# Altium footprint library ref-packages-longpad.PCBLIB: 1527 footprints (part 45 of 103) (continued)
## QFP64_SOT393 [mm] (continued)
  rectangle: -8.6,-1.35 -7.075,-1.05
  rectangle: -8.6,-2.15 -7.075,-1.85
  rectangle: -8.6,-2.95 -7.075,-2.65
  rectangle: -8.6,-3.75 -7.075,-3.45
  rectangle: -8.6,-4.55 -7.075,-4.25
  rectangle: -8.6,-5.35 -7.075,-5.05
  rectangle: -8.6,-6.15 -7.075,-5.85

## QFP80 [mm]
pads (80):
  rect 0.35x1.9 smd: 1(-8.8,-7.53) 2(-8,-7.53) 3(-7.2,-7.53) 4(-6.4,-7.53) 5(-5.6,-7.53) 6(-4.8,-7.53) 7(-4,-7.53) 8(-3.2,-7.53) 9(-2.4,-7.53) 10(-1.6,-7.53) 11(-0.8,-7.53) 12(0,-7.53) 13(0.8,-7.53) 14(1.6,-7.53) 15(2.4,-7.53) 16(3.2,-7.53) 17(4,-7.53) 18(4.8,-7.53) 19(5.6,-7.53) 20(6.4,-7.53) 21(7.2,-7.53) 22(8,-7.53) 23(8.8,-7.53) 24(9.6,-7.53) 41(9.6,8.47) 42(8.8,8.47) 43(8,8.47) 44(7.2,8.47) 45(6.4,8.47) 46(5.6,8.47) 47(4.8,8.47) 48(4,8.47) 49(3.2,8.47) 50(2.4,8.47) 51(1.6,8.47) 52(0.8,8.47) 53(0,8.47) 54(-0.8,8.47) 55(-1.6,8.47) 56(-2.4,8.47) 57(-3.2,8.47) 58(-4,8.47) 59(-4.8,8.47) 60(-5.6,8.47) 61(-6.4,8.47) 62(-7.2,8.47) 63(-8,8.47) 64(-8.8,8.47)
  rect 1.9x0.35 smd: 25(11.4,-5.53) 26(11.4,-4.73) 27(11.4,-3.93) 28(11.4,-3.13) 29(11.4,-2.33) 30(11.4,-1.53) 31(11.4,-0.73) 32(11.4,0.07) 33(11.4,0.87) 34(11.4,1.67) 35(11.4,2.47) 36(11.4,3.27) 37(11.4,4.07) 38(11.4,4.87) 39(11.4,5.67) 40(11.4,6.47) 65(-10.6,6.47) 66(-10.6,5.67) 67(-10.6,4.87) 68(-10.6,4.07) 69(-10.6,3.27) 70(-10.6,2.47) 71(-10.6,1.67) 72(-10.6,0.87) 73(-10.6,0.07) 74(-10.6,-0.73) 75(-10.6,-1.53) 76(-10.6,-2.33) 77(-10.6,-3.13) 78(-10.6,-3.93) 79(-10.6,-4.73) 80(-10.6,-5.53)
Top Overlay:
  circle w0.152: c-7.06,-3.92 r1
  rectangle: -8.975,7.52 -8.625,9.42
  rectangle: 9.425,-8.48 9.775,-6.58
  rectangle: -8.175,7.52 -7.825,9.42
  rectangle: -7.375,7.52 -7.025,9.42
  rectangle: -6.575,7.52 -6.225,9.42
  rectangle: -5.775,7.52 -5.425,9.42
  rectangle: -4.975,7.52 -4.625,9.42
  rectangle: -4.175,7.52 -3.825,9.42
  rectangle: -3.375,7.52 -3.025,9.42
  rectangle: -2.575,7.52 -2.225,9.42
  rectangle: -1.775,7.52 -1.425,9.42
  rectangle: -0.975,7.52 -0.625,9.42
  rectangle: -0.175,7.52 0.175,9.42
  rectangle: 0.625,7.52 0.975,9.42
  rectangle: 1.425,7.52 1.775,9.42
  rectangle: 2.225,7.52 2.575,9.42
  rectangle: 3.025,7.52 3.375,9.42
  rectangle: 3.825,7.52 4.175,9.42
  rectangle: 4.625,7.52 4.975,9.42
  rectangle: 5.425,7.52 5.775,9.42
  rectangle: 6.225,7.52 6.575,9.42
  rectangle: 7.025,7.52 7.375,9.42
  rectangle: 7.825,7.52 8.175,9.42
  rectangle: 8.625,7.52 8.975,9.42
  rectangle: 9.425,7.52 9.775,9.42
  rectangle: -8.975,-8.48 -8.625,-6.58
  rectangle: -8.175,-8.48 -7.825,-6.58
  rectangle: -7.375,-8.48 -7.025,-6.58
  rectangle: -6.575,-8.48 -6.225,-6.58
  rectangle: -5.775,-8.48 -5.425,-6.58
  rectangle: -4.975,-8.48 -4.625,-6.58
  rectangle: -4.175,-8.48 -3.825,-6.58
  rectangle: -3.375,-8.48 -3.025,-6.58
  rectangle: -2.575,-8.48 -2.225,-6.58
  rectangle: -1.775,-8.48 -1.425,-6.58
  rectangle: -0.975,-8.48 -0.625,-6.58
  rectangle: -0.175,-8.48 0.175,-6.58
  rectangle: 0.625,-8.48 0.975,-6.58
  rectangle: 1.425,-8.48 1.775,-6.58
  rectangle: 2.225,-8.48 2.575,-6.58
  rectangle: 3.825,-8.48 4.175,-6.58
  rectangle: 3.025,-8.48 3.375,-6.58
  rectangle: 4.625,-8.48 4.975,-6.58
  rectangle: 5.425,-8.48 5.775,-6.58
  rectangle: 6.225,-8.48 6.575,-6.58
  rectangle: 7.025,-8.48 7.375,-6.58
  rectangle: 7.825,-8.48 8.175,-6.58
  rectangle: 8.625,-8.48 8.975,-6.58
  rectangle: 10.45,-0.105 12.35,0.245
  rectangle: -11.55,-5.705 -9.65,-5.355
  rectangle: 10.45,0.695 12.35,1.045
  rectangle: 10.45,1.495 12.35,1.845
  rectangle: 10.45,2.295 12.35,2.645
  rectangle: 10.45,3.095 12.35,3.445
  rectangle: 10.45,3.895 12.35,4.245
  rectangle: 10.45,4.695 12.35,5.045
  rectangle: 10.45,5.495 12.35,5.845
  rectangle: 10.45,6.295 12.35,6.645
  rectangle: 10.45,-0.905 12.35,-0.555
  rectangle: 10.45,-1.705 12.35,-1.355
  rectangle: 10.45,-2.505 12.35,-2.155
  rectangle: 10.45,-3.305 12.35,-2.955
  rectangle: 10.45,-4.105 12.35,-3.755
  rectangle: 10.45,-4.905 12.35,-4.555
  rectangle: 10.45,-5.705 12.35,-5.355
  rectangle: -11.55,6.295 -9.65,6.645
  rectangle: -11.55,5.495 -9.65,5.845
  rectangle: -11.55,4.695 -9.65,5.045
  rectangle: -11.55,3.895 -9.65,4.245
  rectangle: -11.55,3.095 -9.65,3.445
  rectangle: -11.55,2.295 -9.65,2.645
  rectangle: -11.55,1.495 -9.65,1.845
  rectangle: -11.55,0.695 -9.65,1.045
  rectangle: -11.55,-0.105 -9.65,0.245
  rectangle: -11.55,-0.905 -9.65,-0.555
  rectangle: -11.55,-1.705 -9.65,-1.355
  rectangle: -11.55,-2.505 -9.65,-2.155
  rectangle: -11.55,-3.305 -9.65,-2.955
  rectangle: -11.55,-4.105 -9.65,-3.755
  rectangle: -11.55,-4.905 -9.65,-4.555
  lines w0.152: -9.2,5.47 -9.2,5.67 ; -9.6,-5.93 -9,-6.53 ; -9.6,-5.93 -9.6,6.87 ; -9.6,-5.93 -9.2,-5.73 ; -9.6,6.87 -9,7.47 ; -9.6,6.87 -9.2,6.67 ; -9.2,-5.73 -8.8,-6.13 ; -9.2,-5.73 -9.2,5.67 ; -9.2,5.67 -9.2,6.67 ; -9.2,6.67 -8.8,7.07 ; -9,-6.53 9.8,-6.53 ; -9,-6.53 -8.8,-6.13 ; -9,7.47 9.8,7.47 ; -9,7.47 -8.8,7.07 ; -8.8,-6.13 9.6,-6.13 ; -8.8,7.07 9.6,7.07 ; 9.6,-6.13 10,-5.73 ; 9.6,-6.13 9.8,-6.53 ; 9.6,7.07 10,6.67 ; 9.6,7.07 9.8,7.47 ; 9.8,-6.53 10.4,-5.93 ; 9.8,7.47 10.4,6.87 ; 10,-5.73 10,6.67 ; 10,-5.73 10.4,-5.93 ; 10,6.67 10.4,6.87 ; 10.4,-5.93 10.4,6.87

## QFP80-841 [mm]
pads (80):
  rect 1.2x0.4 smd: 1(-8.3,6.175) 2(-8.3,5.525) 3(-8.3,4.875) 4(-8.3,4.225) 5(-8.3,3.575) 6(-8.3,2.925) 7(-8.3,2.275) 8(-8.3,1.625) 9(-8.3,0.975) 10(-8.3,0.325) 11(-8.3,-0.325) 12(-8.3,-0.975) 13(-8.3,-1.625) 14(-8.3,-2.275) 15(-8.3,-2.925) 16(-8.3,-3.575) 17(-8.3,-4.225) 18(-8.3,-4.875) 19(-8.3,-5.525) 20(-8.3,-6.175) 41(8.3,-6.175) 42(8.3,-5.525) 43(8.3,-4.875) 44(8.3,-4.225) 45(8.3,-3.575) 46(8.3,-2.925) 47(8.3,-2.275) 48(8.3,-1.625) 49(8.3,-0.975) 50(8.3,-0.325) 51(8.3,0.325) 52(8.3,0.975) 53(8.3,1.625) 54(8.3,2.275) 55(8.3,2.925) 56(8.3,3.575) 57(8.3,4.225) 58(8.3,4.875) 59(8.3,5.525) 60(8.3,6.175)
  rect 0.4x1.2 smd: 21(-6.175,-8.3) 22(-5.525,-8.3) 23(-4.875,-8.3) 24(-4.225,-8.3) 25(-3.575,-8.3) 26(-2.925,-8.3) 27(-2.275,-8.3) 28(-1.625,-8.3) 29(-0.975,-8.3) 30(-0.325,-8.3) 31(0.325,-8.3) 32(0.975,-8.3) 33(1.625,-8.3) 34(2.275,-8.3) 35(2.925,-8.3) 36(3.575,-8.3) 37(4.225,-8.3) 38(4.875,-8.3) 39(5.525,-8.3) 40(6.175,-8.3) 61(6.175,8.3) 62(5.525,8.3) 63(4.875,8.3) 64(4.225,8.3) 65(3.575,8.3) 66(2.925,8.3) 67(2.275,8.3) 68(1.625,8.3) 69(0.975,8.3) 70(0.325,8.3) 71(-0.325,8.3) 72(-0.975,8.3) 73(-1.625,8.3) 74(-2.275,8.3) 75(-2.925,8.3) 76(-3.575,8.3) 77(-4.225,8.3) 78(-4.875,8.3) 79(-5.525,8.3) 80(-6.175,8.3)
Top Overlay:
  circle w0.152: c-6.15,6.1 r0.354
  lines w0.152: -6.98,-6.98 6.98,-6.98 6.98,6.98 -6.43,6.98 -6.98,6.43 -6.98,-6.98
Mechanical 16:
  rectangle: -8.7,6 -7.02,6.35
  rectangle: -8.7,5.35 -7.02,5.7
  rectangle: -8.7,4.7 -7.02,5.05
  rectangle: -8.7,4.05 -7.02,4.4
  rectangle: -8.7,3.4 -7.02,3.75
  rectangle: -8.7,2.75 -7.02,3.1
  rectangle: -8.7,2.1 -7.02,2.45
  rectangle: -8.7,1.45 -7.02,1.8
  rectangle: -8.7,0.8 -7.02,1.15
  rectangle: -8.7,0.15 -7.02,0.5
  rectangle: -8.7,-0.5 -7.02,-0.15
  rectangle: -8.7,-1.15 -7.02,-0.8
  rectangle: -8.7,-1.8 -7.02,-1.45
  rectangle: -8.7,-2.45 -7.02,-2.1
  rectangle: -8.7,-3.1 -7.02,-2.75
  rectangle: -8.7,-3.75 -7.02,-3.4
  rectangle: -8.7,-4.4 -7.02,-4.05
  rectangle: -8.7,-5.05 -7.02,-4.7
  rectangle: -8.7,-5.7 -7.02,-5.35
  rectangle: -8.7,-6.35 -7.02,-6
  rectangle: -6.35,-8.7 -6,-7.02
  rectangle: -5.7,-8.7 -5.35,-7.02
  rectangle: -5.05,-8.7 -4.7,-7.02
  rectangle: -4.4,-8.7 -4.05,-7.02
  rectangle: -3.75,-8.7 -3.4,-7.02
  rectangle: -3.1,-8.7 -2.75,-7.02
  rectangle: -2.45,-8.7 -2.1,-7.02
  rectangle: -1.8,-8.7 -1.45,-7.02
  rectangle: -1.15,-8.7 -0.8,-7.02
  rectangle: -0.5,-8.7 -0.15,-7.02
  rectangle: 0.15,-8.7 0.5,-7.02
  rectangle: 0.8,-8.7 1.15,-7.02
  rectangle: 1.45,-8.7 1.8,-7.02
  rectangle: 2.1,-8.7 2.45,-7.02
  rectangle: 2.75,-8.7 3.1,-7.02
  rectangle: 3.4,-8.7 3.75,-7.02
  rectangle: 4.05,-8.7 4.4,-7.02
  rectangle: 4.7,-8.7 5.05,-7.02
  rectangle: 5.35,-8.7 5.7,-7.02
  rectangle: 6,-8.7 6.35,-7.02
  rectangle: 7.02,-6.35 8.7,-6
  rectangle: 7.02,-5.7 8.7,-5.35
  rectangle: 7.02,-5.05 8.7,-4.7
  rectangle: 7.02,-4.4 8.7,-4.05
  rectangle: 7.02,-3.75 8.7,-3.4
  rectangle: 7.02,-3.1 8.7,-2.75
  rectangle: 7.02,-2.45 8.7,-2.1
  rectangle: 7.02,-1.8 8.7,-1.45
  rectangle: 7.02,-1.15 8.7,-0.8
  rectangle: 7.02,-0.5 8.7,-0.15
  rectangle: 7.02,0.15 8.7,0.5
  rectangle: 7.02,0.8 8.7,1.15
  rectangle: 7.02,1.45 8.7,1.8
  rectangle: 7.02,2.1 8.7,2.45
  rectangle: 7.02,2.75 8.7,3.1
  rectangle: 7.02,3.4 8.7,3.75
  rectangle: 7.02,4.05 8.7,4.4
  rectangle: 7.02,4.7 8.7,5.05
  rectangle: 7.02,5.35 8.7,5.7
  rectangle: 7.02,6 8.7,6.35
  rectangle: 6,7.02 6.35,8.7
  rectangle: 5.35,7.02 5.7,8.7
  rectangle: 4.7,7.02 5.05,8.7
  rectangle: 4.05,7.02 4.4,8.7
  rectangle: 3.4,7.02 3.75,8.7
  rectangle: 2.75,7.02 3.1,8.7
  rectangle: 2.1,7.02 2.45,8.7
  rectangle: 1.45,7.02 1.8,8.7
  rectangle: 0.8,7.02 1.15,8.7
  rectangle: 0.15,7.02 0.5,8.7
  rectangle: -0.5,7.02 -0.15,8.7
  rectangle: -1.15,7.02 -0.8,8.7
  rectangle: -1.8,7.02 -1.45,8.7
  rectangle: -2.45,7.02 -2.1,8.7
  rectangle: -3.1,7.02 -2.75,8.7
  rectangle: -3.75,7.02 -3.4,8.7
  rectangle: -4.4,7.02 -4.05,8.7
  rectangle: -5.05,7.02 -4.7,8.7
  rectangle: -5.7,7.02 -5.35,8.7
  rectangle: -6.35,7.02 -6,8.7

## QFP80_SOT310-1 [mm]
pads (80):
  rect 0.4x1.4 smd: 1(-9.2,-8.2) 2(-8.4,-8.2) 3(-7.6,-8.2) 4(-6.8,-8.2) 5(-6,-8.2) 6(-5.2,-8.2) 7(-4.4,-8.2) 8(-3.6,-8.2) 9(-2.8,-8.2) 10(-2,-8.2) 11(-1.2,-8.2) 12(-0.4,-8.2) 13(0.4,-8.2) 14(1.2,-8.2) 15(2,-8.2) 16(2.8,-8.2) 17(3.6,-8.2) 18(4.4,-8.2) 19(5.2,-8.2) 20(6,-8.2) 21(6.8,-8.2) 22(7.6,-8.2) 23(8.4,-8.2) 24(9.2,-8.2) 41(9.2,8.2) 42(8.4,8.2) 43(7.6,8.2) 44(6.8,8.2) 45(6,8.2) 46(5.2,8.2) 47(4.4,8.2) 48(3.6,8.2) 49(2.8,8.2) 50(2,8.2) 51(1.2,8.2) 52(0.4,8.2) 53(-0.4,8.2) 54(-1.2,8.2) 55(-2,8.2) 56(-2.8,8.2) 57(-3.6,8.2) 58(-4.4,8.2) 59(-5.2,8.2) 60(-6,8.2) 61(-6.8,8.2) 62(-7.6,8.2) 63(-8.4,8.2) 64(-9.2,8.2)
  rect 1.4x0.4 smd: 25(11.1,-6) 26(11.1,-5.2) 27(11.1,-4.4) 28(11.1,-3.6) 29(11.1,-2.8) 30(11.1,-2) 31(11.1,-1.2) 32(11.1,-0.4) 33(11.1,0.4) 34(11.1,1.2) 35(11.1,2) 36(11.1,2.8) 37(11.1,3.6) 38(11.1,4.4) 39(11.1,5.2) 40(11.1,6) 65(-11.1,6) 66(-11.1,5.2) 67(-11.1,4.4) 68(-11.1,3.6) 69(-11.1,2.8) 70(-11.1,2) 71(-11.1,1.2) 72(-11.1,0.4) 73(-11.1,-0.4) 74(-11.1,-1.2) 75(-11.1,-2) 76(-11.1,-2.8) 77(-11.1,-3.6) 78(-11.1,-4.4) 79(-11.1,-5.2) 80(-11.1,-6)
Top Overlay:
  circle w0.203: c-9.2,-6 r0.4
  lines w0.203: -10,-7 10,-7 10,7 -10,7 -10,-7
Mechanical 16:
  rectangle: -9.35,-8.65 -9.05,-7.05
  rectangle: -8.55,-8.65 -8.25,-7.05
  rectangle: -7.75,-8.65 -7.45,-7.05
  rectangle: -6.95,-8.65 -6.65,-7.05
  rectangle: -6.15,-8.65 -5.85,-7.05
  rectangle: -5.35,-8.65 -5.05,-7.05
  rectangle: -4.55,-8.65 -4.25,-7.05
  rectangle: -3.75,-8.65 -3.45,-7.05
  rectangle: -2.95,-8.65 -2.65,-7.05
  rectangle: -2.15,-8.65 -1.85,-7.05
  rectangle: -1.35,-8.65 -1.05,-7.05
  rectangle: -0.55,-8.65 -0.25,-7.05
  rectangle: 0.25,-8.65 0.55,-7.05
  rectangle: 1.05,-8.65 1.35,-7.05
  rectangle: 1.85,-8.65 2.15,-7.05
  rectangle: 2.65,-8.65 2.95,-7.05
  rectangle: 3.45,-8.65 3.75,-7.05
  rectangle: 4.25,-8.65 4.55,-7.05
  rectangle: 5.05,-8.65 5.35,-7.05
  rectangle: 5.85,-8.65 6.15,-7.05
  rectangle: 6.65,-8.65 6.95,-7.05
  rectangle: 7.45,-8.65 7.75,-7.05
  rectangle: 8.25,-8.65 8.55,-7.05
  rectangle: 9.05,-8.65 9.35,-7.05
  rectangle: 9.95,-6.15 11.55,-5.85
  rectangle: 9.95,-5.35 11.55,-5.05
  rectangle: 9.95,-4.55 11.55,-4.25
  rectangle: 9.95,-3.75 11.55,-3.45
  rectangle: 9.95,-2.95 11.55,-2.65
  rectangle: 9.95,-2.15 11.55,-1.85
  rectangle: 9.95,-1.35 11.55,-1.05
  rectangle: 9.95,-0.55 11.55,-0.25
  rectangle: 9.95,0.25 11.55,0.55
  rectangle: 9.95,1.05 11.55,1.35
  rectangle: 9.95,1.85 11.55,2.15
  rectangle: 9.95,2.65 11.55,2.95
  rectangle: 9.95,3.45 11.55,3.75
  rectangle: 9.95,4.25 11.55,4.55
  rectangle: 9.95,5.05 11.55,5.35
  rectangle: 9.95,5.85 11.55,6.15
  rectangle: 9.05,7.05 9.35,8.65
  rectangle: 8.25,7.05 8.55,8.65
  rectangle: 7.45,7.05 7.75,8.65
  rectangle: 6.65,7.05 6.95,8.65
  rectangle: 5.85,7.05 6.15,8.65
  rectangle: 5.05,7.05 5.35,8.65
  rectangle: 4.25,7.05 4.55,8.65
  rectangle: 3.45,7.05 3.75,8.65
  rectangle: 2.65,7.05 2.95,8.65
  rectangle: 1.85,7.05 2.15,8.65
  rectangle: 1.05,7.05 1.35,8.65
  rectangle: 0.25,7.05 0.55,8.65
  rectangle: -0.55,7.05 -0.25,8.65
  rectangle: -1.35,7.05 -1.05,8.65
  rectangle: -2.15,7.05 -1.85,8.65
  rectangle: -2.95,7.05 -2.65,8.65
  rectangle: -3.75,7.05 -3.45,8.65
  rectangle: -4.55,7.05 -4.25,8.65
  rectangle: -5.35,7.05 -5.05,8.65
  rectangle: -6.15,7.05 -5.85,8.65
  rectangle: -6.95,7.05 -6.65,8.65
  rectangle: -7.75,7.05 -7.45,8.65
  rectangle: -8.55,7.05 -8.25,8.65
  rectangle: -9.35,7.05 -9.05,8.65
  rectangle: -11.55,5.85 -9.95,6.15
  rectangle: -11.55,5.05 -9.95,5.35
  rectangle: -11.55,4.25 -9.95,4.55
  rectangle: -11.55,3.45 -9.95,3.75
  rectangle: -11.55,2.65 -9.95,2.95
  rectangle: -11.55,1.85 -9.95,2.15
  rectangle: -11.55,1.05 -9.95,1.35
  rectangle: -11.55,0.25 -9.95,0.55
  rectangle: -11.55,-0.55 -9.95,-0.25
  rectangle: -11.55,-1.35 -9.95,-1.05
  rectangle: -11.55,-2.15 -9.95,-1.85
  rectangle: -11.55,-2.95 -9.95,-2.65
  rectangle: -11.55,-3.75 -9.95,-3.45
  rectangle: -11.55,-4.55 -9.95,-4.25
  rectangle: -11.55,-5.35 -9.95,-5.05
  rectangle: -11.55,-6.15 -9.95,-5.85

## QFP80_SOT318 [mm]
pads (80):
  rect 0.4x1.4 smd: 1(-9.2,-8.5) 2(-8.4,-8.5) 3(-7.6,-8.5) 4(-6.8,-8.5) 5(-6,-8.5) 6(-5.2,-8.5) 7(-4.4,-8.5) 8(-3.6,-8.5) 9(-2.8,-8.5) 10(-2,-8.5) 11(-1.2,-8.5) 12(-0.4,-8.5) 13(0.4,-8.5) 14(1.2,-8.5) 15(2,-8.5) 16(2.8,-8.5) 17(3.6,-8.5) 18(4.4,-8.5) 19(5.2,-8.5) 20(6,-8.5) 21(6.8,-8.5) 22(7.6,-8.5) 23(8.4,-8.5) 24(9.2,-8.5) 41(9.2,8.5) 42(8.4,8.5) 43(7.6,8.5) 44(6.8,8.5) 45(6,8.5) 46(5.2,8.5) 47(4.4,8.5) 48(3.6,8.5) 49(2.8,8.5) 50(2,8.5) 51(1.2,8.5) 52(0.4,8.5) 53(-0.4,8.5) 54(-1.2,8.5) 55(-2,8.5) 56(-2.8,8.5) 57(-3.6,8.5) 58(-4.4,8.5) 59(-5.2,8.5) 60(-6,8.5) 61(-6.8,8.5) 62(-7.6,8.5) 63(-8.4,8.5) 64(-9.2,8.5)
  rect 1.4x0.4 smd: 25(11.5,-6) 26(11.5,-5.2) 27(11.5,-4.4) 28(11.5,-3.6) 29(11.5,-2.8) 30(11.5,-2) 31(11.5,-1.2) 32(11.5,-0.4) 33(11.5,0.4) 34(11.5,1.2) 35(11.5,2) 36(11.5,2.8) 37(11.5,3.6) 38(11.5,4.4) 39(11.5,5.2) 40(11.5,6) 65(-11.5,6) 66(-11.5,5.2) 67(-11.5,4.4) 68(-11.5,3.6) 69(-11.5,2.8) 70(-11.5,2) 71(-11.5,1.2) 72(-11.5,0.4) 73(-11.5,-0.4) 74(-11.5,-1.2) 75(-11.5,-2) 76(-11.5,-2.8) 77(-11.5,-3.6) 78(-11.5,-4.4) 79(-11.5,-5.2) 80(-11.5,-6)
Top Overlay:
  circle w0.203: c-9.2,-6 r0.4
  lines w0.203: -10.1,-7 10.1,-7 10.1,7 -10.1,7 -10.1,-7
Mechanical 16:
  rectangle: -9.35,-8.65 -9.05,-7.05
  rectangle: -8.55,-8.65 -8.25,-7.05
  rectangle: -7.75,-8.65 -7.45,-7.05
  rectangle: -6.95,-8.65 -6.65,-7.05
  rectangle: -6.15,-8.65 -5.85,-7.05
  rectangle: -5.35,-8.65 -5.05,-7.05
  rectangle: -4.55,-8.65 -4.25,-7.05
  rectangle: -3.75,-8.65 -3.45,-7.05
  rectangle: -2.95,-8.65 -2.65,-7.05
  rectangle: -2.15,-8.65 -1.85,-7.05
  rectangle: -1.35,-8.65 -1.05,-7.05
  rectangle: -0.55,-8.65 -0.25,-7.05
  rectangle: 0.25,-8.65 0.55,-7.05
  rectangle: 1.05,-8.65 1.35,-7.05
  rectangle: 1.85,-8.65 2.15,-7.05
  rectangle: 2.65,-8.65 2.95,-7.05
  rectangle: 3.45,-8.65 3.75,-7.05
  rectangle: 4.25,-8.65 4.55,-7.05
  rectangle: 5.05,-8.65 5.35,-7.05
  rectangle: 5.85,-8.65 6.15,-7.05
  rectangle: 6.65,-8.65 6.95,-7.05
  rectangle: 7.45,-8.65 7.75,-7.05
  rectangle: 8.25,-8.65 8.55,-7.05
  rectangle: 9.05,-8.65 9.35,-7.05
  rectangle: 10.05,-6.15 11.65,-5.85
  rectangle: 10.05,-5.35 11.65,-5.05
  rectangle: 10.05,-4.55 11.65,-4.25
  rectangle: 10.05,-3.75 11.65,-3.45
  rectangle: 10.05,-2.95 11.65,-2.65
  rectangle: 10.05,-2.15 11.65,-1.85
  rectangle: 10.05,-1.35 11.65,-1.05
  rectangle: 10.05,-0.55 11.65,-0.25
  rectangle: 10.05,0.25 11.65,0.55
  rectangle: 10.05,1.05 11.65,1.35
  rectangle: 10.05,1.85 11.65,2.15
  rectangle: 10.05,2.65 11.65,2.95
  rectangle: 10.05,3.45 11.65,3.75
  rectangle: 10.05,4.25 11.65,4.55
  rectangle: 10.05,5.05 11.65,5.35
  rectangle: 10.05,5.85 11.65,6.15
  rectangle: 9.05,7.05 9.35,8.65
  rectangle: 8.25,7.05 8.55,8.65
  rectangle: 7.45,7.05 7.75,8.65
  rectangle: 6.65,7.05 6.95,8.65
  rectangle: 5.85,7.05 6.15,8.65
  rectangle: 5.05,7.05 5.35,8.65
  rectangle: 4.25,7.05 4.55,8.65
  rectangle: 3.45,7.05 3.75,8.65
  rectangle: 2.65,7.05 2.95,8.65
  rectangle: 1.85,7.05 2.15,8.65
  rectangle: 1.05,7.05 1.35,8.65
  rectangle: 0.25,7.05 0.55,8.65
  rectangle: -0.55,7.05 -0.25,8.65
  rectangle: -1.35,7.05 -1.05,8.65
  rectangle: -2.15,7.05 -1.85,8.65
  rectangle: -2.95,7.05 -2.65,8.65
  rectangle: -3.75,7.05 -3.45,8.65
  rectangle: -4.55,7.05 -4.25,8.65
  rectangle: -5.35,7.05 -5.05,8.65
  rectangle: -6.15,7.05 -5.85,8.65
  rectangle: -6.95,7.05 -6.65,8.65
  rectangle: -7.75,7.05 -7.45,8.65
  rectangle: -8.55,7.05 -8.25,8.65
  rectangle: -9.35,7.05 -9.05,8.65
  rectangle: -11.65,5.85 -10.05,6.15
  rectangle: -11.65,5.05 -10.05,5.35
  rectangle: -11.65,4.25 -10.05,4.55
  rectangle: -11.65,3.45 -10.05,3.75
  rectangle: -11.65,2.65 -10.05,2.95
  rectangle: -11.65,1.85 -10.05,2.15
  rectangle: -11.65,1.05 -10.05,1.35
  rectangle: -11.65,0.25 -10.05,0.55
  rectangle: -11.65,-0.55 -10.05,-0.25
  rectangle: -11.65,-1.35 -10.05,-1.05
  rectangle: -11.65,-2.15 -10.05,-1.85
  rectangle: -11.65,-2.95 -10.05,-2.65
  rectangle: -11.65,-3.75 -10.05,-3.45
  rectangle: -11.65,-4.55 -10.05,-4.25
  rectangle: -11.65,-5.35 -10.05,-5.05
  rectangle: -11.65,-6.15 -10.05,-5.85

## QFP80_SOT496-1 [mm]
pads (80):
  rect 0.4x1.4 smd: 1(-6.175,-8.125) 2(-5.525,-8.125) 3(-4.875,-8.125) 4(-4.225,-8.125) 5(-3.575,-8.125) 6(-2.925,-8.125) 7(-2.275,-8.125) 8(-1.625,-8.125) 9(-0.975,-8.125) 10(-0.325,-8.125) 11(0.325,-8.125) 12(0.975,-8.125) 13(1.625,-8.125) 14(2.275,-8.125) 15(2.925,-8.125) 16(3.575,-8.125) 17(4.225,-8.125) 18(4.875,-8.125) 19(5.525,-8.125) 20(6.175,-8.125) 41(6.175,8.125) 42(5.525,8.125) 43(4.875,8.125) 44(4.225,8.125) 45(3.575,8.125) 46(2.925,8.125) 47(2.275,8.125) 48(1.625,8.125) 49(0.975,8.125) 50(0.325,8.125) 51(-0.325,8.125) 52(-0.975,8.125) 53(-1.625,8.125) 54(-2.275,8.125) 55(-2.925,8.125) 56(-3.575,8.125) 57(-4.225,8.125) 58(-4.875,8.125) 59(-5.525,8.125) 60(-6.175,8.125)
  rect 1.4x0.4 smd: 21(8.125,-6.175) 22(8.125,-5.525) 23(8.125,-4.875) 24(8.125,-4.225) 25(8.125,-3.575) 26(8.125,-2.925) 27(8.125,-2.275) 28(8.125,-1.625) 29(8.125,-0.975) 30(8.125,-0.325) 31(8.125,0.325) 32(8.125,0.975) 33(8.125,1.625) 34(8.125,2.275) 35(8.125,2.925) 36(8.125,3.575) 37(8.125,4.225) 38(8.125,4.875) 39(8.125,5.525) 40(8.125,6.175) 61(-8.125,6.175) 62(-8.125,5.525) 63(-8.125,4.875) 64(-8.125,4.225) 65(-8.125,3.575) 66(-8.125,2.925) 67(-8.125,2.275) 68(-8.125,1.625) 69(-8.125,0.975) 70(-8.125,0.325) 71(-8.125,-0.325) 72(-8.125,-0.975) 73(-8.125,-1.625) 74(-8.125,-2.275) 75(-8.125,-2.925) 76(-8.125,-3.575) 77(-8.125,-4.225) 78(-8.125,-4.875) 79(-8.125,-5.525) 80(-8.125,-6.175)
Top Overlay:
  circle w0.203: c-6.1,-6.1 r0.4
  lines w0.203: -7,-7 7,-7 7,7 -7,7 -7,-7
Mechanical 16:
  rectangle: -6.325,-8.575 -6.025,-6.975
  rectangle: -5.675,-8.575 -5.375,-6.975
  rectangle: -5.025,-8.575 -4.725,-6.975
  rectangle: -4.375,-8.575 -4.075,-6.975
  rectangle: -3.725,-8.575 -3.425,-6.975
  rectangle: -3.075,-8.575 -2.775,-6.975
  rectangle: -2.425,-8.575 -2.125,-6.975
  rectangle: -1.775,-8.575 -1.475,-6.975
  rectangle: -1.125,-8.575 -0.825,-6.975
  rectangle: -0.475,-8.575 -0.175,-6.975
  rectangle: 0.175,-8.575 0.475,-6.975
  rectangle: 0.825,-8.575 1.125,-6.975
  rectangle: 1.475,-8.575 1.775,-6.975
  rectangle: 2.125,-8.575 2.425,-6.975
  rectangle: 2.775,-8.575 3.075,-6.975
  rectangle: 3.425,-8.575 3.725,-6.975
  rectangle: 4.075,-8.575 4.375,-6.975
  rectangle: 4.725,-8.575 5.025,-6.975
  rectangle: 5.375,-8.575 5.675,-6.975
  rectangle: 6.025,-8.575 6.325,-6.975
  rectangle: 6.975,-6.325 8.575,-6.025
  rectangle: 6.975,-5.675 8.575,-5.375
  rectangle: 6.975,-5.025 8.575,-4.725
  rectangle: 6.975,-4.375 8.575,-4.075
  rectangle: 6.975,-3.725 8.575,-3.425
  rectangle: 6.975,-3.075 8.575,-2.775
  rectangle: 6.975,-2.425 8.575,-2.125
  rectangle: 6.975,-1.775 8.575,-1.475
  rectangle: 6.975,-1.125 8.575,-0.825
  rectangle: 6.975,-0.475 8.575,-0.175
  rectangle: 6.975,0.175 8.575,0.475
  rectangle: 6.975,0.825 8.575,1.125
  rectangle: 6.975,1.475 8.575,1.775
  rectangle: 6.975,2.125 8.575,2.425
  rectangle: 6.975,2.775 8.575,3.075
  rectangle: 6.975,3.425 8.575,3.725
  rectangle: 6.975,4.075 8.575,4.375
  rectangle: 6.975,4.725 8.575,5.025
  rectangle: 6.975,5.375 8.575,5.675
  rectangle: 6.975,6.025 8.575,6.325
  rectangle: 6.025,6.975 6.325,8.575
  rectangle: 5.375,6.975 5.675,8.575
  rectangle: 4.725,6.975 5.025,8.575
  rectangle: 4.075,6.975 4.375,8.575
  rectangle: 3.425,6.975 3.725,8.575
  rectangle: 2.775,6.975 3.075,8.575
  rectangle: 2.125,6.975 2.425,8.575
  rectangle: 1.475,6.975 1.775,8.575
  rectangle: 0.825,6.975 1.125,8.575
  rectangle: 0.175,6.975 0.475,8.575
  rectangle: -0.475,6.975 -0.175,8.575
  rectangle: -1.125,6.975 -0.825,8.575
  rectangle: -1.775,6.975 -1.475,8.575
  rectangle: -2.425,6.975 -2.125,8.575
  rectangle: -3.075,6.975 -2.775,8.575
  rectangle: -3.725,6.975 -3.425,8.575
  rectangle: -4.375,6.975 -4.075,8.575
  rectangle: -5.025,6.975 -4.725,8.575
  rectangle: -5.675,6.975 -5.375,8.575
  rectangle: -6.325,6.975 -6.025,8.575
  rectangle: -8.575,6.025 -6.975,6.325
  rectangle: -8.575,5.375 -6.975,5.675
  rectangle: -8.575,4.725 -6.975,5.025
  rectangle: -8.575,4.075 -6.975,4.375
  rectangle: -8.575,3.425 -6.975,3.725
  rectangle: -8.575,2.775 -6.975,3.075
  rectangle: -8.575,2.125 -6.975,2.425
  rectangle: -8.575,1.475 -6.975,1.775
  rectangle: -8.575,0.825 -6.975,1.125
  rectangle: -8.575,0.175 -6.975,0.475
  rectangle: -8.575,-0.475 -6.975,-0.175
  rectangle: -8.575,-1.125 -6.975,-0.825
  rectangle: -8.575,-1.775 -6.975,-1.475
  rectangle: -8.575,-2.425 -6.975,-2.125
  rectangle: -8.575,-3.075 -6.975,-2.775
  rectangle: -8.575,-3.725 -6.975,-3.425
  rectangle: -8.575,-4.375 -6.975,-4.075
  rectangle: -8.575,-5.025 -6.975,-4.725
  rectangle: -8.575,-5.675 -6.975,-5.375
  rectangle: -8.575,-6.325 -6.975,-6.025

## QFP80R [mm]
pads (80):
  rect 0.5x1.8 smd: 1(-9.2,-8.1) 2(-8.4,-8.1) 3(-7.6,-8.1) 4(-6.8,-8.1) 5(-6,-8.1) 6(-5.2,-8.1) 7(-4.4,-8.1) 8(-3.6,-8.1) 9(-2.8,-8.1) 10(-2,-8.1) 11(-1.2,-8.1) 12(-0.4,-8.1) 13(0.4,-8.1) 14(1.2,-8.1) 15(2,-8.1) 16(2.8,-8.1) 17(3.6,-8.1) 18(4.4,-8.1) 19(5.2,-8.1) 20(6,-8.1) 21(6.8,-8.1) 22(7.6,-8.1) 23(8.4,-8.1) 24(9.2,-8.1) 41(9.2,8.1) 42(8.4,8.1) 43(7.6,8.1) 44(6.8,8.1) 45(6,8.1) 46(5.2,8.1) 47(4.4,8.1) 48(3.6,8.1) 49(2.8,8.1) 50(2,8.1) 51(1.2,8.1) 52(0.4,8.1) 53(-0.4,8.1) 54(-1.2,8.1) 55(-2,8.1) 56(-2.8,8.1) 57(-3.6,8.1) 58(-4.4,8.1) 59(-5.2,8.1) 60(-6,8.1) 61(-6.8,8.1) 62(-7.6,8.1) 63(-8.4,8.1) 64(-9.2,8.1)
  rect 1.8x0.5 smd: 25(11.1,-6) 26(11.1,-5.2) 27(11.1,-4.4) 28(11.1,-3.6) 29(11.1,-2.8) 30(11.1,-2) 31(11.1,-1.2) 32(11.1,-0.4) 33(11.1,0.4) 34(11.1,1.2) 35(11.1,2) 36(11.1,2.8) 37(11.1,3.6) 38(11.1,4.4) 39(11.1,5.2) 40(11.1,6) 65(-11.1,6) 66(-11.1,5.2) 67(-11.1,4.4) 68(-11.1,3.6) 69(-11.1,2.8) 70(-11.1,2) 71(-11.1,1.2) 72(-11.1,0.4) 73(-11.1,-0.4) 74(-11.1,-1.2) 75(-11.1,-2) 76(-11.1,-2.8) 77(-11.1,-3.6) 78(-11.1,-4.4) 79(-11.1,-5.2) 80(-11.1,-6)
Top Overlay:
  circle w0.254: c-8.25,-5.5 r0.75
  lines w0.203: -9.57,-6.56 9.56,-6.56 9.56,6.56 -9.57,6.56 -9.57,-6.56
Mechanical 16:
  rectangle: -9.42,-8.72 -8.98,-6.95
  rectangle: 9.95,-6.22 11.72,-5.78
  rectangle: -8.62,-8.72 -8.18,-6.95
  rectangle: -7.82,-8.72 -7.38,-6.95
  rectangle: -7.02,-8.72 -6.58,-6.95
  rectangle: -6.22,-8.72 -5.78,-6.95
  rectangle: -5.42,-8.72 -4.98,-6.95
  rectangle: -4.62,-8.72 -4.18,-6.95
  rectangle: -3.82,-8.72 -3.38,-6.95
  rectangle: -3.02,-8.72 -2.58,-6.95
  rectangle: -2.22,-8.72 -1.78,-6.95
  rectangle: -1.42,-8.72 -0.98,-6.95
  rectangle: -0.62,-8.72 -0.18,-6.95
  rectangle: 0.18,-8.72 0.62,-6.95
  rectangle: 0.98,-8.72 1.42,-6.95
  rectangle: 1.78,-8.72 2.22,-6.95
  rectangle: 2.58,-8.72 3.02,-6.95
  rectangle: 3.38,-8.72 3.82,-6.95
  rectangle: 4.18,-8.72 4.62,-6.95
  rectangle: 4.98,-8.72 5.42,-6.95
  rectangle: 5.78,-8.72 6.22,-6.95
  rectangle: 6.58,-8.72 7.02,-6.95
  rectangle: 7.38,-8.72 7.82,-6.95
  rectangle: 8.18,-8.72 8.62,-6.95
  rectangle: 8.98,-8.72 9.42,-6.95
  rectangle: 9.95,-5.42 11.72,-4.98
  rectangle: 9.95,-4.62 11.72,-4.18
  rectangle: 9.95,-3.82 11.72,-3.38
  rectangle: 9.95,-3.02 11.72,-2.58
  rectangle: 9.95,-2.22 11.72,-1.78
  rectangle: 9.95,-1.42 11.72,-0.98
  rectangle: 9.95,-0.62 11.72,-0.18
  rectangle: 9.95,0.18 11.72,0.62
  rectangle: 9.95,0.98 11.72,1.42
  rectangle: 9.95,1.78 11.72,2.22
  rectangle: 9.95,2.58 11.72,3.02
  rectangle: 9.95,3.38 11.72,3.82
  rectangle: 9.95,4.18 11.72,4.62
  rectangle: 9.95,4.98 11.72,5.42
  rectangle: 9.95,5.78 11.72,6.22
  rectangle: 8.98,6.95 9.42,8.72
  rectangle: 8.18,6.95 8.62,8.72
  rectangle: 7.38,6.95 7.82,8.72
  rectangle: 6.58,6.95 7.02,8.72
  rectangle: 5.78,6.95 6.22,8.72
  rectangle: 4.98,6.95 5.42,8.72
  rectangle: 4.18,6.95 4.62,8.72
  rectangle: 3.38,6.95 3.82,8.72
  rectangle: 2.58,6.95 3.02,8.72
  rectangle: 1.78,6.95 2.22,8.72
  rectangle: 0.98,6.95 1.42,8.72
  rectangle: 0.18,6.95 0.62,8.72
  rectangle: -0.62,6.95 -0.18,8.72
  rectangle: -1.42,6.95 -0.98,8.72
  rectangle: -2.22,6.95 -1.78,8.72
  rectangle: -3.02,6.95 -2.58,8.72
  rectangle: -3.82,6.95 -3.38,8.72
  rectangle: -4.62,6.95 -4.18,8.72
  rectangle: -5.42,6.95 -4.98,8.72
  rectangle: -6.22,6.95 -5.78,8.72
  rectangle: -7.02,6.95 -6.58,8.72
  rectangle: -7.82,6.95 -7.38,8.72
  rectangle: -8.62,6.95 -8.18,8.72
  rectangle: -9.42,6.95 -8.98,8.72
  rectangle: -11.72,5.78 -9.95,6.22
  rectangle: -11.72,4.98 -9.95,5.42
  rectangle: -11.72,4.18 -9.95,4.62
  rectangle: -11.72,3.38 -9.95,3.82
  rectangle: -11.72,2.58 -9.95,3.02
  rectangle: -11.72,1.78 -9.95,2.22
  rectangle: -11.72,0.98 -9.95,1.42
  rectangle: -11.72,0.18 -9.95,0.62
  rectangle: -11.72,-0.62 -9.95,-0.18
  rectangle: -11.72,-1.42 -9.95,-0.98
  rectangle: -11.72,-2.22 -9.95,-1.78
  rectangle: -11.72,-3.02 -9.95,-2.58
  rectangle: -11.72,-3.82 -9.95,-3.38
  rectangle: -11.72,-4.62 -9.95,-4.18
  rectangle: -11.72,-5.42 -9.95,-4.98
  rectangle: -11.72,-6.22 -9.95,-5.78
  lines w0.203: -9.9,-6.9 9.9,-6.9 9.9,6.9 -9.9,6.9 -9.9,-6.9